# Altium footprint library pcb2D3D库101.PcbLib: 411 footprints (part 21 of 26)
Each footprint in its own frame and in the unit in brackets; x right, y up, seen from the top. Pads: shape width x height; smd on the part's side, far side on the other; paste and mask are expansions set on the pad; w line width, h text height; cw(c..) or ccw(c..) is an arc to the next point about the centre after c.
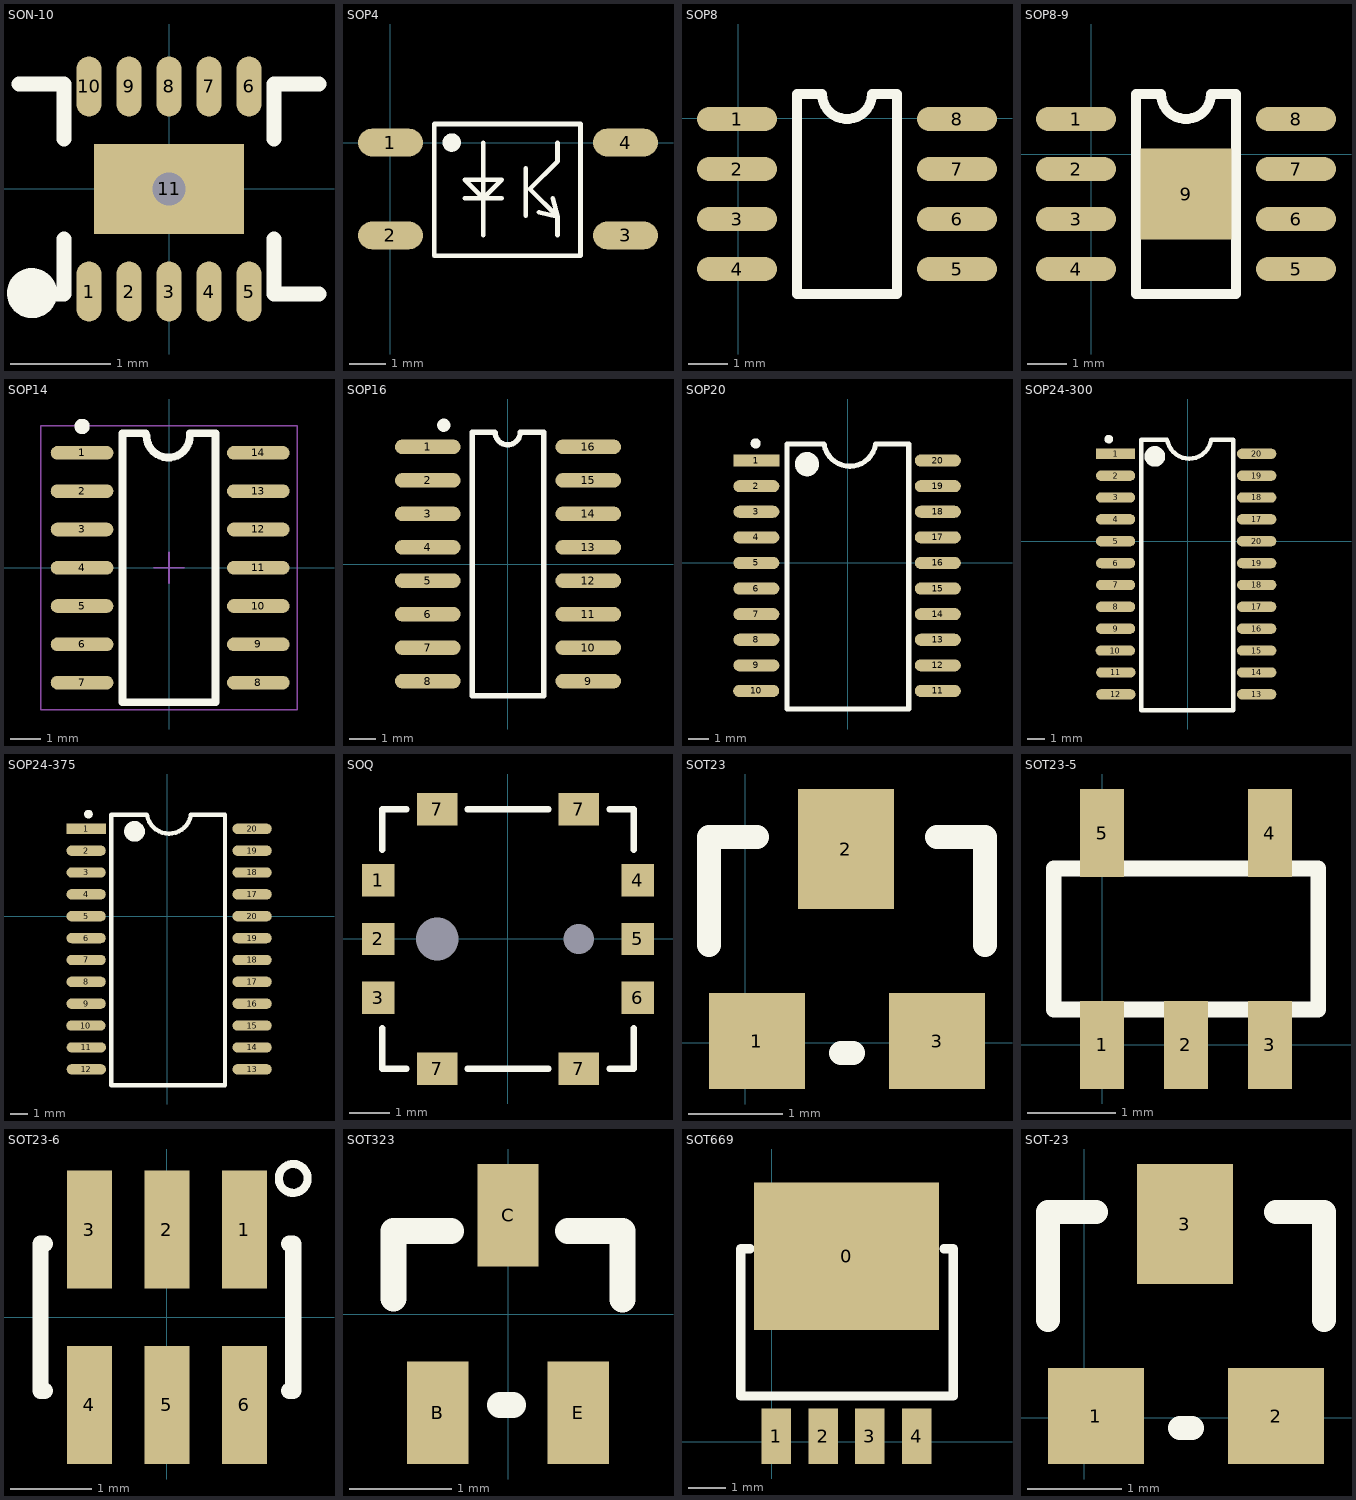
[diagram p20: the footprints below, top view; thin cyan lines are the x and y axes]

## SON-10 [mm]
height 0.8
pads (11):
  oval 0.25x0.6 smd: 1(-0.8,-1.025) 2(-0.4,-1.025) 3(0,-1.025) 4(0.4,-1.025) 5(0.8,-1.025) 6(0.8,1.025) 7(0.4,1.025) 8(0,1.025) 9(-0.4,1.025) 10(-0.8,1.025)
  rect 1.5x0.9 smd: 11(0,0)
via 0,0 diameter 0.66 hole 0.33
TopOverlay:
  circle w0.25: c-1.37,-1.041 r0.125
  lines w0.152: -1.5,-1.05 -1.05,-1.05 -1.05,-0.5 ; -1.5,1.05 -1.05,1.05 -1.05,0.5 ; 1.05,-0.5 1.05,-1.05 1.5,-1.05 ; 1.05,0.5 1.05,1.05 1.5,1.05
3D body "SON-10.STEP": height 0.8, standoff 0, extent -1.05,-1.055 1.05,1.055

## SOP4 [mil] "AQY211G2S"
pads (4):
  oval 70x30 smd: 1(0,0) 2(0,-100) 3(253.23,-100) 4(253.23,0)
TopOverlay:
  circle w10: c65.94,0 r4.92
  lines w5: 80,-60 120,-60 ; 100,-100 100,0 ; 145.67,-78.74 145.67,-27.56 ; 160,-75 180,-80 ; 175,-60 180,-80 ; 180,-100 180,-80 ; 180,0 180,-20 150,-50 180,-80 ; 47.24,-121.73 204.72,-121.73 204.72,20 47.24,20 47.24,-121.73 ; 80,-40 100,-60 120,-40 80,-40
3D body "User Library-HCPL-181-1.STEP": height 78.74, standoff -3.96, extent -7.87,-122.05 267.72,19.69

## SOP8 [mil]
pads (8):
  oval 80x24 smd: 1(-1,-1) 2(-1,-51) 3(-1,-101) 4(-1,-151) 5(219,-151) 6(219,-101) 7(219,-51) 8(219,-1)
TopOverlay:
  lines w10: 59,-176 59,24 84,24 ccw(c109,24) 134,24 159,24 159,-176 59,-176
3D body "SOP8.STEP": height 62.99, standoff 0, extent -8.7,-173.62 229.17,24.02

## SOP8-9 [mil]
pads (9):
  oval 80x24 smd: 1(-15,35) 2(-15,-15) 3(-15,-65) 4(-15,-115) 5(205,-115) 6(205,-65) 7(205,-15) 8(205,35)
  rect 90.55x90.55 smd: 9(95,-40)
TopOverlay:
  lines w10: 45,-140 45,60 70,60 ccw(c95,60) 120,60 145,60 145,-140 45,-140
3D body "User Library-sop-8.STEP": height 62.99, standoff 0, extent -23.94,-138.82 213.93,58.82

## SOP14 [mm] "LM339"
height 1.8
pads (14):
  oval 2.05x0.45 smd: 1(-2.845,3.759) 2(-2.845,2.506) 3(-2.845,1.253) 4(-2.845,0) 5(-2.845,-1.253) 6(-2.845,-2.506) 7(-2.845,-3.759) 8(2.921,-3.759) 9(2.921,-2.506) 10(2.921,-1.253) 11(2.921,0) 12(2.921,1.253) 13(2.921,2.506) 14(2.921,3.759)
TopOverlay:
  circle w0.25: c-2.843,4.623 r0.125
  lines w0.254: -0.762,4.4 -1.525,4.4 -1.525,-4.4 1.525,-4.4 1.525,4.4 0.686,4.4 ; -0.737,4.318 ccw(c-0.025,4.318) 0.685,4.342
Mechanical15:
  lines w0.051: -0.5,0 0.5,0 ; 0,-0.5 0,0.5 ; -4.2,-4.65 4.2,-4.65 4.2,4.65 -4.2,4.65 -4.2,-4.65
3D body "SOP14.STEP": height 1.61, standoff 0, extent -3.151,-4.376 3.049,4.324

## SOP16 [mm] "SOP, 16-Leads, Body 9.90x3.90mm, Pitch 1.27mm, IPC Medium Density"
height 1.75
pads (16):
  oval 2.5x0.55 smd: 1(-3.035,4.445) 2(-3.035,3.175) 3(-3.035,1.905) 4(-3.035,0.635) 5(-3.035,-0.635) 6(-3.035,-1.905) 7(-3.035,-3.175) 8(-3.035,-4.445) 9(3.06,-4.445) 10(3.06,-3.175) 11(3.06,-1.905) 12(3.06,-0.635) 13(3.06,0.635) 14(3.06,1.905) 15(3.06,3.175) 16(3.06,4.445)
TopOverlay:
  circle w0.25: c-2.425,5.27 r0.125
  lines w0.2: -0.483,5 -1.346,5 -1.346,-5 1.372,-5 1.372,5 0.475,5 ; -0.475,4.997 ccw(c0,4.996) 0.475,4.997
3D body "SOP16_208mil (5_3mm).STEP": height 1.8, standoff -0.2, extent -3.986,-5.1 3.935,5.1

## SOP20 [mm]
height 2.36
pads (20):
  rect 2.286x0.6 smd: 1(-4.534,5.08)
  oval 2.286x0.6 smd: 2(-4.534,3.81) 3(-4.534,2.54) 4(-4.534,1.27) 5(-4.534,0) 6(-4.534,-1.27) 7(-4.534,-2.54) 8(-4.534,-3.81) 9(-4.534,-5.08) 10(-4.544,-6.35) 11(4.465,-6.35) 12(4.465,-5.08) 13(4.465,-3.81) 14(4.465,-2.54) 15(4.465,-1.27) 16(4.465,0) 17(4.465,1.27) 18(4.465,2.54) 19(4.465,3.81) 20(4.465,5.08)
TopOverlay:
  circle w0.6: c-2.025,4.9 r0.3
  circle w0.25: c-4.575,5.93 r0.125
  lines w0.254: -1.194,5.9 -3.025,5.9 -3.025,-7.239 3.025,-7.239 3.025,5.9 1.372,5.9 ; -1.17,5.844 ccw(c0.101,6.094) 1.372,5.842
3D body "User Library-SO-20 (Wide).step": height 2.7, standoff 0, extent -5.15,-7.009 5.15,5.791

## SOP24-300 [mil]
height 92.91
pads (24):
  rect 90x23.62 smd: 1(-164.5,200)
  oval 90x23.62 smd: 2(-164.5,150) 3(-164.5,100) 4(-164.5,50) 5(-164.5,0) 6(-164.5,-50) 7(-164.5,-100) 8(-164.5,-150) 9(-164.5,-200) 10(-164.9,-250) 11(-164,-300) 12(-164,-350) 13(158,-350) 14(158,-300) 15(158,-250) 16(158,-200) 17(158,-150) 17(158,50) 18(158,-100) 18(158,100) 19(158,-50) 19(158,150) 20(158,0) 20(158,200)
TopOverlay:
  circle w23.62: c-74.81,194 r11.81
  circle w9.84: c-180.12,233.46 r4.92
  lines w10: -47,232.28 -106,232.28 -106,-386 105,-386 105,232.28 54,232.28 ; -46.07,230.07 ccw(c3.97,239.91) 54,230

## SOP24-375 [mil]
height 92.91
pads (24):
  rect 90x23.62 smd: 1(-185.5,200)
  oval 90x23.62 smd: 2(-185.5,150) 3(-185.5,100) 4(-185.5,50) 5(-185.5,0) 6(-185.5,-50) 7(-185.5,-100) 8(-185.5,-150) 9(-185.5,-200) 10(-185.9,-250) 11(-185,-300) 12(-185,-350) 13(194,-350) 14(194,-300) 15(194,-250) 16(194,-200) 17(194,-150) 17(194,50) 18(194,-100) 18(194,100) 19(194,-50) 19(194,150) 20(194,0) 20(194,200)
TopOverlay:
  circle w9.84: c-180.12,233.46 r4.92
  circle w23.62: c-74.81,194 r11.81
  lines w10: -47,232.28 -128,232.28 -128,-386 132,-386 132,232.28 54,232.28 ; -46.07,230.07 ccw(c3.97,239.91) 54,230
3D body "SOP24.STEP": height 74.8, standoff 1.06, extent -203,-383.99 209,234

## SOQ [mm]
height 0.127
pads (12):
  rect 0.8x0.8 smd: 1(-3.2,1.45) 2(-3.2,0) 3(-3.2,-1.45) 4(3.2,1.45) 5(3.2,0) 6(3.2,-1.45)
  rect 1x0.8 smd: 7(-1.75,-3.2) 7(-1.75,3.2) 7(1.75,-3.2) 7(1.75,3.2)
  round 0 hole 1.05: ""(-1.75,0)
  round 0 hole 0.75: ""(1.75,0)
TopOverlay:
  lines w0.152: -3.1,-2.2 -3.1,-3.2 -2.5,-3.2 ; -3.1,2.2 -3.1,3.2 -2.5,3.2 ; -1,-3.2 1,-3.2 ; -1,3.2 1,3.2 ; 2.5,-3.2 3.1,-3.2 3.1,-2.2 ; 2.5,3.2 3.1,3.2 3.1,2.2
3D body "SOQ.STEP": height 5, standoff -0.5, extent -3.322,-3.2 3.322,3.2

## SOT23 [mil]
pads (3):
  rect 40x40 smd: 1(4.88,0.63) 3(79.88,0.63)
  rect 40x50 smd: 2(41.88,80.63)
TopOverlay:
  lines w10: -15.12,40.63 -15.12,85.63 4.88,85.63 ; 39.88,-4.37 44.88,-4.37 ; 79.88,85.63 99.88,85.63 99.88,40.63
3D body "SOT-23-3.STEP": height 47.24, standoff 0, extent -14.87,-11.02 99.3,99.22

## SOT23-5 [mm]
pads (5):
  rect 0.5x1 smd: 1(0,0) 2(0.95,0) 3(1.9,0) 4(1.9,2.4) 5(0,2.4)
TopOverlay:
  lines w0.178: -0.55,0.4 -0.55,2 2.45,2 2.45,0.4 -0.55,0.4
3D body "User Library-SOT23-5.STEP": height 1.09, standoff -0.01, extent -0.5,-0.201 2.399,2.599

## SOT23-6 [mm] "SOT-23/SC-74A; 5 Leads; Body 3.1 x 3 mm, inc. leads (LxW max)"
height 1.45
pads (6):
  rect 0.55x1.45 smd: 1(0.95,1.075) 2(0,1.075) 3(-0.95,1.075) 4(-0.95,-1.075) 5(0,-1.075) 6(0.95,-1.075)
TopOverlay:
  circle w0.1: c1.549,1.702 r0.177
  lines w0.2: -1.5,-0.9 -1.55,-0.9 -1.55,0.9 -1.5,0.9 ; 1.5,-0.9 1.55,-0.9 1.55,0.9 1.5,0.9
3D body "User Library-SOT-23-6.STEP": height 1.08, standoff -0.01, extent -1.397,-1.194 1.397,1.232

## SOT323 [mm]
pads (3):
  rect 0.6x1 smd: B(-0.686,-0.965) C(0,0.965) E(0.686,-0.965)
TopOverlay:
  lines w0.254: -1.118,0.152 -1.118,0.813 -0.559,0.813 ; -0.076,-0.889 0.051,-0.889 ; 0.584,0.813 1.118,0.813 1.118,0.143
3D body "SOT323 (SC70-3)-1.STEP": height 1.1, standoff 0, extent -1.092,-1.097 1.108,1.148

## SOT669 [mm] "IFPAK"
pads (5):
  rect 5x4 smd: 0(2.032,5.029)
  rect 0.8x1.5 smd: 1(0.127,0.152) 2(1.397,0.152) 3(2.667,0.152) 4(3.937,0.152)
TopOverlay:
  lines w0.254: -0.584,5.232 -0.838,5.232 -0.838,1.245 4.928,1.245 4.928,5.232 4.674,5.232
3D body "User Library-SOT669-CW.step": height 1.55, standoff 0.35, extent -0.418,-0.002 4.482,6.426

## SOT-23 [mil]
pads (3):
  rect 40x40 smd: 1(4.88,0.63) 2(79.88,0.63)
  rect 40x50 smd: 3(41.88,80.63)
TopOverlay:
  lines w10: -15.12,40.63 -15.12,85.63 4.88,85.63 ; 39.88,-4.37 44.88,-4.37 ; 79.88,85.63 99.88,85.63 99.88,40.63
3D body "SOT-23-3.STEP": height 47.24, standoff 0, extent -14.87,-11.02 99.3,99.22